# Altium footprint library LongMen.PcbLib: 245 footprints (part 12 of 16)
Each footprint in its own frame and in the unit in brackets; x right, y up, seen from the top. Pads: shape width x height; smd on the part's side, far side on the other; paste and mask are expansions set on the pad; w line width, h text height; cw(c..) or ccw(c..) is an arc to the next point about the centre after c.
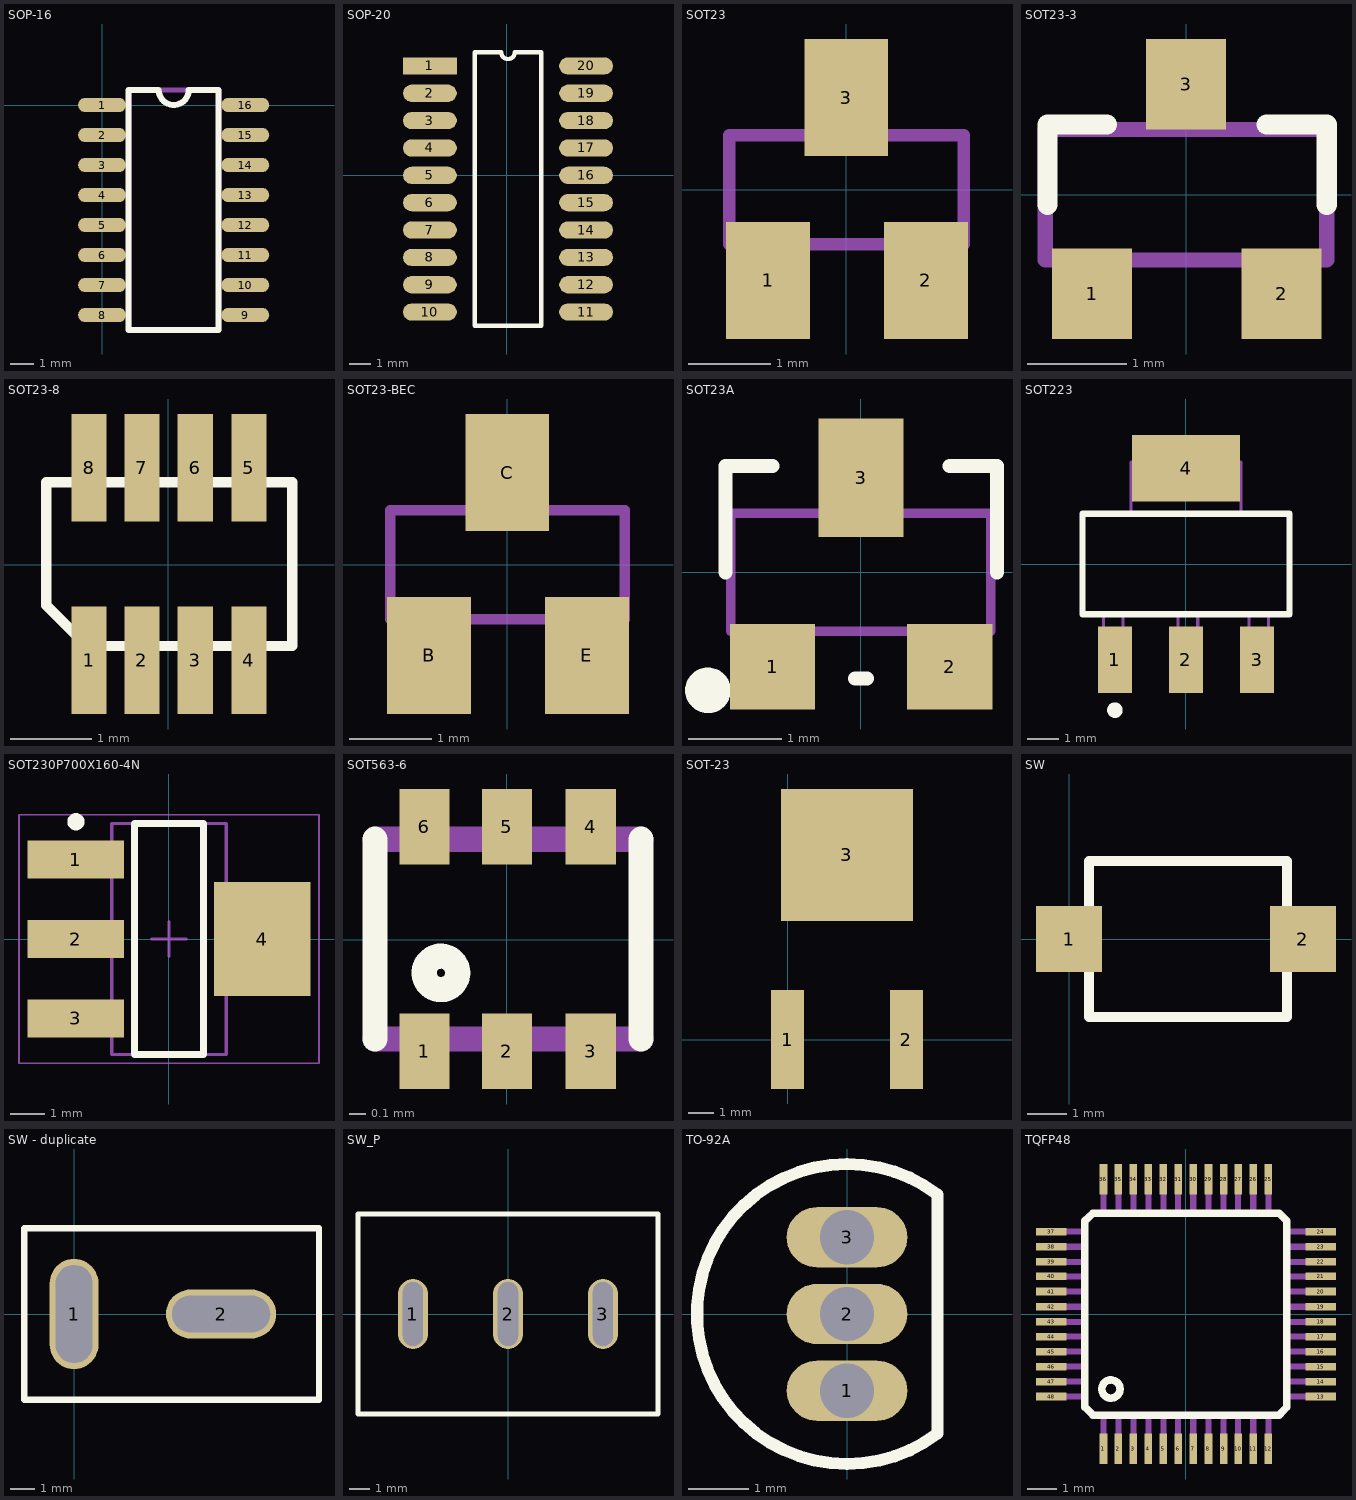
[diagram p11: the footprints below, top view; thin cyan lines are the x and y axes]

## SOP-16 [mil]
pads (16):
  oval 80x24 smd: 1(0,0) 2(0,-50) 3(0,-100) 4(0,-150) 5(0,-200) 6(0,-250) 7(0,-300) 8(0,-350) 9(238.5,-350) 10(238.5,-300) 11(238.5,-250) 12(238.5,-200) 13(238.5,-150) 14(238.5,-100) 15(238.5,-50) 16(238.5,0)
Top Overlay:
  lines w10: 44.25,-375 44.25,25 94.25,25 ccw(c119.25,25) 144.25,25 194.25,25 194.25,-375 44.25,-375
Mechanical 1:
  lines w7.87: 45,-375 45,25 195,25 195,-375 45,-375
3D body: height 39.37, standoff 0, extent 41.06,-378.94 198.94,28.94

## SOP-20 [mm] "74ls244"
height 2.032
pads (20):
  rect 2.5x0.8 smd: 1(-3.556,5.08)
  oval 2.5x0.8 smd: 2(-3.556,3.81) 3(-3.556,2.54) 4(-3.556,1.27) 5(-3.556,0) 6(-3.556,-1.27) 7(-3.556,-2.54) 8(-3.556,-3.81) 9(-3.556,-5.08) 10(-3.556,-6.35) 11(3.694,-6.35) 12(3.694,-5.08) 13(3.694,-3.81) 14(3.694,-2.54) 15(3.694,-1.27) 16(3.694,0) 17(3.694,1.27) 18(3.694,2.54) 19(3.694,3.81) 20(3.694,5.08)
Top Overlay:
  lines w0.2: -1.471,-6.985 -1.471,5.715 -0.249,5.715 ccw(c0.069,5.715) 0.386,5.715 1.609,5.715 1.609,-6.985 -1.471,-6.985

## SOT23 [mil] "SOT23"
pads (3):
  rect 40x56 smd: 1(-37.4,-43.31) 2(38,-43.31) 3(0,44)
Mechanical 16:
  rectangle: -9,28 9,51
  rectangle: 28,-51 46,-28
  rectangle: -46,-51 -28,-28
  lines w6: -56,-26 56,-26 56,26 -56,26 -56,-26
3D body: height 51.18, standoff 0, extent -57.09,-50.12 57.09,60.12

## SOT23-3 [mil] "SOT23-3"
pads (3):
  rect 32x36 smd: 1(-37.4,-39.37) 2(38,-39.37) 3(0,44)
Top Overlay:
  lines w8: -55.12,-3.94 -55.12,28 -31.5,28 ; 32,28 56,28 56,-3.94
Mechanical 16:
  lines w6: -56,-26 56,-26 56,26 -56,26 -56,-26
3D body: height 51.18, standoff 0, extent -57.09,-55.12 57.09,55.12

## SOT23-8 [mil] "SOT23-8"
pads (8):
  rect 17x52 smd: 1(-38.39,-46.26) 2(-12.8,-46.26) 3(13,-46.26) 4(39,-46.26) 5(39,47) 6(13,47) 7(-12.8,47) 8(-38.39,47)
Top Overlay:
  lines w5: -59.06,-19.68 -39.37,-39.37 60,-39.37 60,40 -59.06,40 -59.06,-19.68
3D body: height 43.6, standoff 0, extent -59.05,-55.19 59.06,55.19

## SOT23-BEC [mil] "SOT23-BEC"
pads (3):
  rect 40x56 smd: B(-37.4,-43.31) C(0,44) E(38,-43.31)
Mechanical 16:
  rectangle: -9,28 9,51
  rectangle: 28,-51 46,-28
  rectangle: -46,-51 -28,-28
  lines w5: -56,-26 56,-26 56,26 -56,26 -56,-26
3D body: height 51.18, standoff 0, extent -57.09,-55.12 57.09,55.12

## SOT23A [mil]
pads (3):
  rect 36x36 smd: 1(-37.34,-40) 2(37.66,-40)
  rect 36x50 smd: 3(0.17,40)
Top Overlay:
  circle w10: c-64.67,-50 r4.67
  lines w6: -57.33,0 -57.33,45 -37.33,45 ; -2.33,-45 2.67,-45 ; 37.67,45 57.67,45 57.67,0
Mechanical 16:
  lines w3.94: -55.12,25 55.12,25 ; -55,25 -55,-25 55,-25 55,25
3D body: height 35.43, standoff 0, extent -54.98,-24.98 54.98,24.98

## SOT223 [mm] "SOT-223/SC-73; 4 Leads; Body 6.7 x 7.3 mm, inc. leads (LxW max)"
height 1.8
pads (4):
  rect 1.1x2.15 smd: 1(-2.3,-3.1) 2(0,-3.1) 3(2.3,-3.1)
  rect 3.5x2.15 smd: 4(0,3.1)
Top Overlay:
  circle w0.25: c-2.3,-4.725 r0.125
  lines w0.2: -3.35,-1.625 3.35,-1.625 3.35,1.625 -3.35,1.625 -3.35,-1.625
Mechanical 16:
  lines w0.1: -2.667,-3.175 -2.667,-1.651 -2.032,-1.651 -2.032,-3.175 -2.667,-3.175 ; -1.778,1.651 -1.778,3.302 1.778,3.302 1.778,1.651 -1.778,1.651 ; -0.254,-3.175 -0.254,-1.651 0.381,-1.651 0.381,-3.175 -0.254,-3.175 ; 2.032,-3.175 2.032,-1.651 2.667,-1.651 2.667,-3.175 2.032,-3.175
3D body: height 1.8, standoff 0, extent -3.349,-1.624 3.349,1.624
3D body: height 0.2, standoff 0, extent 2.033,-3.174 2.666,-1.652
3D body: height 0.2, standoff 0, extent -0.253,-3.174 0.38,-1.652
3D body: height 0.2, standoff 0, extent -1.777,1.652 1.777,3.301
3D body: height 0.2, standoff 0, extent -2.666,-3.174 -2.033,-1.652

## SOT230P700X160-4N [mm] "SOT223, 4-Leads, Body 6.50x7.00mm (avg), Pitch 2.30mm, IPC Medium Density"
height 1.6
pads (4):
  rect 2.8x1.1 smd: 1(-2.7,2.3) 2(-2.7,0) 3(-2.7,-2.3)
  rect 2.8x3.3 smd: 4(2.7,0)
Top Overlay:
  circle w0.25: c-2.7,3.4 r0.125
  lines w0.2: -1,-3.35 -1,3.35 1,3.35 1,-3.35 -1,-3.35
Mechanical 13:
  lines w0.1: -1.655,-3.35 -1.655,3.35 1.655,3.35 1.655,-3.35 -1.655,-3.35
Mechanical 15:
  lines w0.05: -4.35,-3.6 -4.35,3.6 4.35,3.6 4.35,-3.6 -4.35,-3.6
  lines w0.1: -0.5,0 0.5,0 ; 0,-0.5 0,0.5
3D body: height 1.6, standoff 0.02, extent -1.655,-3.35 1.655,3.35

## SOT563-6 [mil] "SOT563-6"
pads (6):
  rect 12x18 smd: 1(-19.68,-26.57) 2(0,-26.57) 3(20,-26.57) 4(20,27) 5(0,27) 6(-19.68,27)
Top Overlay:
  circle w6: c-15.75,-7.87 r4
  lines w6: -31.5,-23.62 -31.5,24 ; 32,-23.62 32,24
Mechanical 16:
  lines w6: -31.5,-23.62 32,-23.62 ; -31.5,24 32,24
3D body: height 23, standoff 0, extent -31.5,-32 31.5,32

## SOT-23 [mil]
pads (3):
  rect 50x150 smd: 1(0,0) 2(180,0)
  rect 200x200 smd: 3(90,280)

## SW [mm]
pads (2):
  rect 1.7x1.7 smd: 1(0,0) 2(6,0)
Top Overlay:
  lines w0.254: 0.508,-2 0.508,2 5.588,2 5.588,-2 0.508,-2

## SW - duplicate [mm]
pads (2):
  oval 2x4.5 hole 1.5 slot 4 at 90 deg: 1(0,0)
  oval 4.5x2 hole 1.5 slot 4 at 0 deg: 2(6,0)
Top Overlay:
  lines w0.254: -2.032,-3.5 10,-3.5 10,3.5 -2.032,3.5 -2.032,-3.5

## SW_P [mm]
pads (3):
  oval 1.5x3.5 hole 1 slot 3.2 at 90 deg: 1(-4.75,0) 2(0,0) 3(4.75,0)
Top Overlay:
  lines w0.254: -7.5,-5 -7.5,5 7.5,5 7.5,-5 -7.5,-5

## TO-92A [mm]
height 6.86
pads (3):
  oval 2x1 hole 0.9: 1(0,-1.27) 2(0,0) 3(0,1.27)
Top Overlay:
  lines w0.2: 1.5,-1.98 cw(c0,0) 1.5,1.98 1.5,-1.98

## TQFP48 [mil] "TQFP48"
pads (48):
  rect 10x40 smd: 1(-108.27,-177.17) 2(-88.58,-177.17) 3(-68.9,-177.17) 4(-49.21,-177.17) 5(-29.53,-177.17) 6(-9.84,-177.17) 7(10,-177.17) 8(30,-177.17) 9(50,-177.17) 10(69,-177.17) 11(89,-177.17) 12(109,-177.17) 25(109,178) 26(89,178) 27(69,178) 28(50,178) 29(30,178) 30(10,178) 31(-9.84,178) 32(-29.53,178) 33(-49.21,178) 34(-68.9,178) 35(-88.58,178) 36(-108.27,178)
  rect 40x10 smd: 13(178,-108.27) 14(178,-88.58) 15(178,-68.9) 16(178,-49.21) 17(178,-29.53) 18(178,-9.84) 19(178,10) 20(178,30) 21(178,50) 22(178,69) 23(178,89) 24(178,109) 37(-177.17,109) 38(-177.17,89) 39(-177.17,69) 40(-177.17,50) 41(-177.17,30) 42(-177.17,10) 43(-177.17,-9.84) 44(-177.17,-29.53) 45(-177.17,-49.21) 46(-177.17,-68.9) 47(-177.17,-88.58) 48(-177.17,-108.27)
Top Overlay:
  circle w10: c-98.43,-98.43 r12
  lines w10: -132.87,-122.05 -122.05,-132.87 123,-132.87 133,-122.05 133,123 123,133 -122.05,133 -132.87,123 -132.87,-122.05
Mechanical 16:
  rectangle: -112.2,-177.16 -104.33,-135.83
  rectangle: -92.52,-177.16 -84.64,-135.82
  rectangle: -72.83,-177.16 -64.96,-135.83
  rectangle: -53.15,-177.16 -45.27,-135.82
  rectangle: -33.46,-177.16 -25.59,-135.82
  rectangle: -13.78,-177.16 -5.91,-135.83
  rectangle: 6,-177.16 14,-135.82
  rectangle: 26,-177.16 34,-135.82
  rectangle: 46,-177.17 54,-135.83
  rectangle: 65,-177.17 73,-135.83
  rectangle: 85,-177.16 93,-135.83
  rectangle: 105,-177.16 113,-135.82
  rectangle: 136,-112.2 178,-104.33
  rectangle: 136,-92.52 178,-84.64
  rectangle: 136,-72.83 178,-64.96
  rectangle: 136,-53.15 178,-45.27
  rectangle: 136,-33.46 178,-25.59
  rectangle: 136,-13.78 178,-5.9
  rectangle: 136,6 178,14
  rectangle: 136,26 178,34
  rectangle: 136,46 178,54
  rectangle: 136,65 178,73
  rectangle: 136,85 178,93
  rectangle: 136,105 178,113
  rectangle: 105,136 113,178
  rectangle: 85,136 93,178
  rectangle: 65,136 73,178
  rectangle: 46,136 54,178
  rectangle: 26,136 34,178
  rectangle: 6,136 14,178
  rectangle: -13.78,136 -5.9,178
  rectangle: -33.46,136 -25.59,178
  rectangle: -53.15,136 -45.27,178
  rectangle: -72.83,136 -64.96,178
  rectangle: -92.52,136 -84.65,178
  rectangle: -112.2,136 -104.33,178
  rectangle: -177.17,105 -135.83,113
  rectangle: -177.17,85 -135.83,93
  rectangle: -177.16,65 -135.83,73
  rectangle: -177.17,46 -135.83,54
  rectangle: -177.17,26 -135.83,34
  rectangle: -177.17,6 -135.83,14
  rectangle: -177.16,-13.78 -135.83,-5.91
  rectangle: -177.17,-33.46 -135.83,-25.59
  rectangle: -177.17,-53.15 -135.83,-45.28
  rectangle: -177.17,-72.83 -135.83,-64.96
  rectangle: -177.16,-92.52 -135.82,-84.64
  rectangle: -177.16,-112.2 -135.82,-104.33
  lines w1: -133.86,-122.05 -122.05,-133.86 123,-133.86 134,-122.05 134,123 123,134 -122.05,134 -133.86,123 -133.86,-122.05
3D body: height 43.31, standoff 0, extent -177.51,-177.5 177.51,177.51